# Altium footprint library DIOT_temperature_logger.PcbLib: 100 footprints (part 7 of 7)
Each footprint in its own frame and in the unit in brackets; x right, y up, seen from the top. Pads: shape width x height; smd on the part's side, far side on the other; paste and mask are expansions set on the pad; w line width, h text height; cw(c..) or ccw(c..) is an arc to the next point about the centre after c.
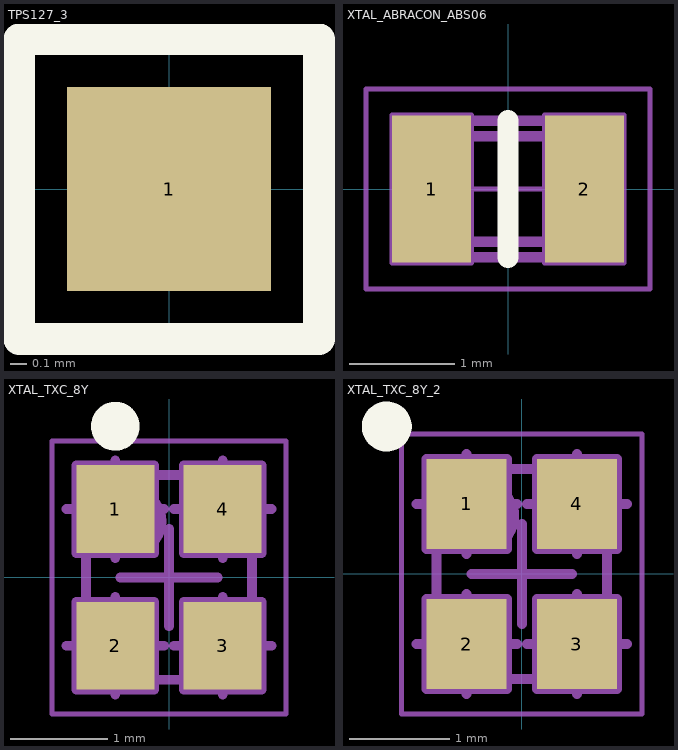
[diagram p6: the footprints below, top view; thin cyan lines are the x and y axes]

## TPS127_3 [mm]
pads (1):
  rect 1.27x1.27 smd paste-1.27: 1(0,0)
Top Overlay:
  lines w0.2: -0.935,-0.935 -0.935,0.935 0.935,0.935 0.935,-0.935 -0.935,-0.935
Mechanical 14:
  lines w0.1: -0.585,-0.585 0.585,-0.585 0.585,0.585 -0.585,0.585 -0.585,-0.585

## XTAL_ABRACON_ABS06 [mm] "2 Pins, 2.15x1.3mm, SMD Low Profile Crystal, ABS06 Series"
height 0.6
pads (2):
  rect 0.75x1.4 smd: 1(-0.725,0) 2(0.725,0)
Top Overlay:
  lines w0.2: 0,-0.65 0,0.65
Mechanical 8:
  lines w0.05: -1.1,0 -0.725,0 ; -0.725,-0.7 -0.725,0 ; -0.725,0.7 -0.725,0 ; 0,-0.5 0,0 ; 0,0.5 0,0 ; 0.725,-0.7 0.725,0 ; 0.725,0.7 0.725,0 ; 1.1,0 0.725,0 ; -0.725,0 -0.35,0 0,0 ; 0,0 0.35,0 0.725,0 ; -1.1,-0.7 -0.35,-0.7 -0.35,0.7 -1.1,0.7 -1.1,-0.7 ; 0.35,-0.7 1.1,-0.7 1.1,0.7 0.35,0.7 0.35,-0.7
Mechanical 14:
  lines w0.1: -1.075,-0.55 cw(c-1.075,-0.65) -0.975,-0.65 0.975,-0.65 cw(c1.075,-0.65) 1.075,-0.55 1.075,0.55 cw(c1.075,0.65) 0.975,0.65 -0.975,0.65 cw(c-1.075,0.65) -1.075,0.55 -1.075,-0.55 ; -0.9,-0.4 ccw(c-0.8,-0.4) -0.8,-0.5 0.8,-0.5 ccw(c0.8,-0.4) 0.9,-0.4 0.9,0.4 ccw(c0.8,0.4) 0.8,0.5 -0.8,0.5 ccw(c-0.8,0.4) -0.9,0.4 -0.9,-0.4
Mechanical 15:
  lines w0.05: -1.35,-0.95 1.35,-0.95 1.35,0.95 -1.35,0.95 -1.35,-0.95
3D body "XTAL_ABRACON_ABS06.stp": height 0.6, standoff 0, extent -1.075,-0.65 1.075,0.65

## XTAL_TXC_8Y [mm] "4 Pins, 2x1.6mm, SMD Seam Sealing Crystal, 8Y Serie"
height 0.5
pads (4):
  rect 0.8x0.9 smd: 1(-0.55,0.7) 2(-0.55,-0.7) 3(0.55,-0.7) 4(0.55,0.7)
Top Overlay:
  circle w0.25: c-0.55,1.55 r0.125
Mechanical 8:
  lines w0.1: -1.05,-0.7 -0.55,-0.7 ; -1.05,0.7 -0.55,0.7 ; -0.55,-1.2 -0.55,-0.7 ; -0.55,-0.2 -0.55,-0.7 ; -0.55,0.2 -0.55,0.7 ; -0.55,1.2 -0.55,0.7 ; -0.5,0 0,0 ; -0.05,-0.7 -0.55,-0.7 ; -0.05,0.7 -0.55,0.7 ; 0,-0.5 0,0 ; 0,0.5 0,0 ; 0.05,-0.7 0.55,-0.7 ; 0.05,0.7 0.55,0.7 ; 0.5,0 0,0 ; 0.55,-1.2 0.55,-0.7 ; 0.55,-0.2 0.55,-0.7 ; 0.55,0.2 0.55,0.7 ; 0.55,1.2 0.55,0.7 ; 1.05,-0.7 0.55,-0.7 ; 1.05,0.7 0.55,0.7 ; -0.95,-1.15 -0.95,-0.25 -0.15,-0.25 -0.15,-1.15 -0.95,-1.15 ; -0.95,0.25 -0.95,1.15 -0.15,1.15 -0.15,0.25 -0.95,0.25 ; 0.15,-1.15 0.15,-0.25 0.95,-0.25 0.95,-1.15 0.15,-1.15 ; 0.15,0.25 0.15,1.15 0.95,1.15 0.95,0.25 0.15,0.25
Mechanical 14:
  circle w0.1: c-0.375,0.575 r0.3
  lines w0.1: -0.85,-0.95 cw(c-0.85,-1.05) -0.75,-1.05 0.75,-1.05 cw(c0.85,-1.05) 0.85,-0.95 0.85,0.95 cw(c0.85,1.05) 0.75,1.05 -0.75,1.05 cw(c-0.85,1.05) -0.85,0.95 -0.85,-0.95
Mechanical 15:
  lines w0.05: -1.2,-1.4 -1.2,1.4 1.2,1.4 1.2,-1.4 -1.2,-1.4
3D body "XTAL_TXC_8Y.stp": height 0.5, standoff 0, extent -0.85,-1.05 0.85,1.05

## XTAL_TXC_8Y_2 [mm]
pads (4):
  rect 0.8x0.9 smd: 1(-0.55,0.7) 2(-0.55,-0.7) 3(0.55,-0.7) 4(0.55,0.7)
Top Overlay:
  circle w0.25: c-1.35,1.475 r0.125
Mechanical 8:
  lines w0.1: -1.05,-0.7 -0.55,-0.7 ; -1.05,0.7 -0.55,0.7 ; -0.55,-1.2 -0.55,-0.7 ; -0.55,-0.2 -0.55,-0.7 ; -0.55,0.2 -0.55,0.7 ; -0.55,1.2 -0.55,0.7 ; -0.5,0 0,0 ; -0.05,-0.7 -0.55,-0.7 ; -0.05,0.7 -0.55,0.7 ; 0,-0.5 0,0 ; 0,0.5 0,0 ; 0.05,-0.7 0.55,-0.7 ; 0.05,0.7 0.55,0.7 ; 0.5,0 0,0 ; 0.55,-1.2 0.55,-0.7 ; 0.55,-0.2 0.55,-0.7 ; 0.55,0.2 0.55,0.7 ; 0.55,1.2 0.55,0.7 ; 1.05,-0.7 0.55,-0.7 ; 1.05,0.7 0.55,0.7 ; -0.95,-1.15 -0.15,-1.15 -0.15,-0.25 -0.95,-0.25 -0.95,-1.15 ; -0.95,0.25 -0.15,0.25 -0.15,1.15 -0.95,1.15 -0.95,0.25 ; 0.15,-1.15 0.95,-1.15 0.95,-0.25 0.15,-0.25 0.15,-1.15 ; 0.15,0.25 0.95,0.25 0.95,1.15 0.15,1.15 0.15,0.25
Mechanical 14:
  circle w0.1: c-0.375,0.575 r0.3
  lines w0.1: -0.85,-0.95 cw(c-0.85,-1.05) -0.75,-1.05 0.75,-1.05 cw(c0.85,-1.05) 0.85,-0.95 0.85,0.95 cw(c0.85,1.05) 0.75,1.05 -0.75,1.05 cw(c-0.85,1.05) -0.85,0.95 -0.85,-0.95
Mechanical 15:
  lines w0.05: -1.2,-1.4 1.2,-1.4 1.2,1.4 -1.2,1.4 -1.2,-1.4
3D body "XTAL_TXC_8Y.stp": height 0.5, standoff 0, extent -0.85,-1.05 0.85,1.05